# Altium footprint library TinyShuffle v.0.PcbLib: 54 footprints (part 3 of 4)
Each footprint in its own frame and in the unit in brackets; x right, y up, seen from the top. Pads: shape width x height; smd on the part's side, far side on the other; paste and mask are expansions set on the pad; w line width, h text height; cw(c..) or ccw(c..) is an arc to the next point about the centre after c.
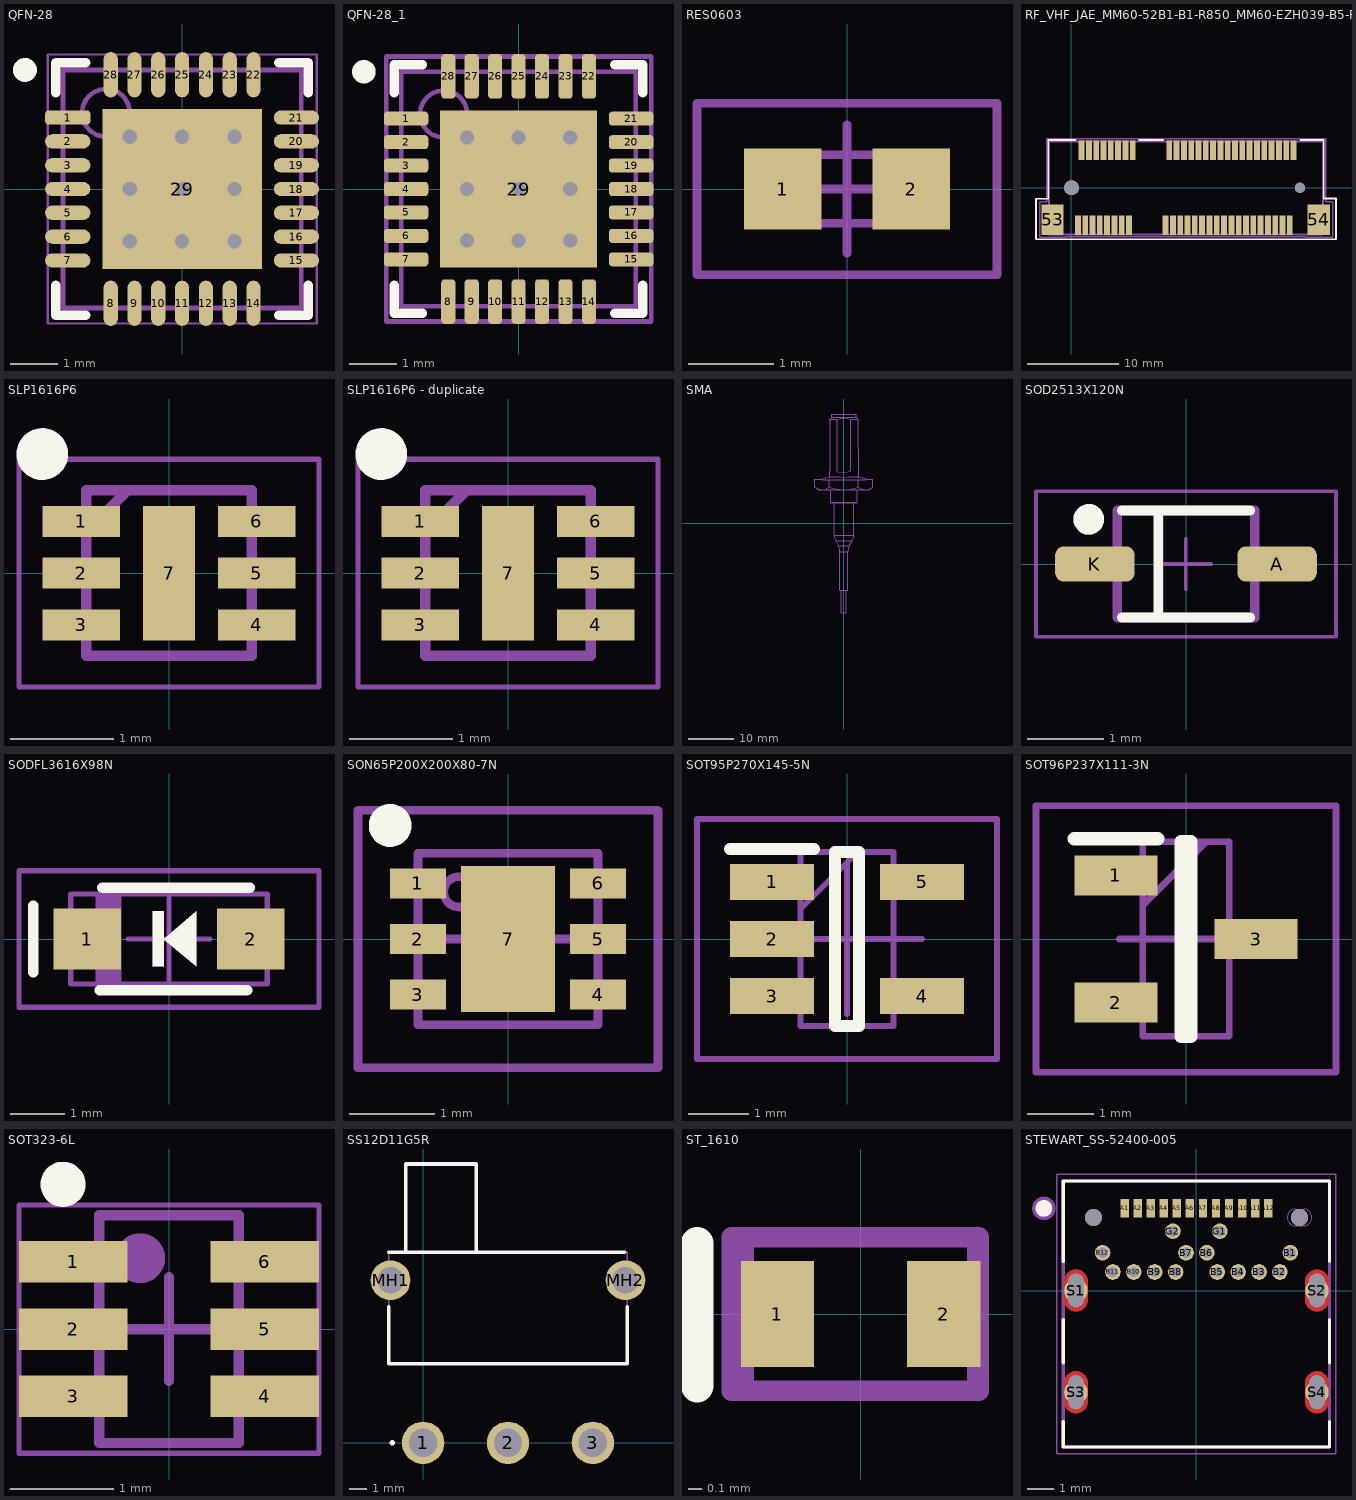
[diagram p2: the footprints below, top view; thin cyan lines are the x and y axes]

## QFN-28 [mm] "QFN, 28-Leads, Body 5,00x5,00mm, Pitch 0,50mm, Thermal Pad 3,20x3,20mm, IPC High Density"
height 0.8
pads (29):
  rrect50% 0.95x0.3 smd: 1(-2.4,1.5)
  oval 0.95x0.3 smd: 2(-2.4,1) 3(-2.4,0.5) 4(-2.4,0) 5(-2.4,-0.5) 6(-2.4,-1) 7(-2.4,-1.5) 15(2.4,-1.5) 16(2.4,-1) 17(2.4,-0.5) 18(2.4,0) 19(2.4,0.5) 20(2.4,1) 21(2.4,1.5)
  oval 0.3x0.95 smd: 8(-1.5,-2.4) 9(-1,-2.4) 10(-0.5,-2.4) 11(0,-2.4) 12(0.5,-2.4) 13(1,-2.4) 14(1.5,-2.4) 22(1.5,2.4) 23(1,2.4) 24(0.5,2.4) 25(0,2.4) 26(-0.5,2.4) 27(-1,2.4) 28(-1.5,2.4)
  rect 3.35x3.35 smd: 29(0,0)
via 0,0 diameter 0.5 hole 0.3
via 1.1,-1.1 diameter 0.5 hole 0.3
via 0,-1.1 diameter 0.5 hole 0.3
via -1.1,-1.1 diameter 0.5 hole 0.3
via 1.1,0 diameter 0.5 hole 0.3
via -1.1,0 diameter 0.5 hole 0.3
via 1.1,1.1 diameter 0.5 hole 0.3
via 0,1.1 diameter 0.5 hole 0.3
via -1.1,1.1 diameter 0.5 hole 0.3
Top Overlay:
  circle w0.25: c-3.3,2.5 r0.125
  lines w0.2: -2.65,-2.025 -2.65,-2.65 -2.025,-2.65 ; -2.65,2.025 -2.65,2.65 -2.025,2.65 ; 2.025,-2.65 2.65,-2.65 2.65,-2.025 ; 2.025,2.65 2.65,2.65 2.65,2.025
Top Assembly (Mech11):
  circle w0.1: c-1.6,1.6 r0.5
  lines w0.1: -2.5,-2.5 2.5,-2.5 2.5,2.5 -2.5,2.5 -2.5,-2.5
Top Courtyard:
  lines w0.05: -2.825,-2.825 2.825,-2.825 2.825,2.825 -2.825,2.825 -2.825,-2.825
  lines w0.1: -0.5,0 0.5,0 ; 0,-0.5 0,0.5
3D body: height 0.8, standoff 0.01, extent -2.5,-2.5 2.5,2.5

## QFN-28_1 [mm] "QFN, 28-Leads, Body 5,00x5,00mm, Pitch 0,50mm, Thermal Pad 3,35x3,35mm, IPC High Density"
height 0.75
pads (29):
  rrect50% 0.95x0.3 smd: 1(-2.4,1.5) 2(-2.4,1) 3(-2.4,0.5) 4(-2.4,0) 5(-2.4,-0.5) 6(-2.4,-1) 7(-2.4,-1.5) 15(2.4,-1.5) 16(2.4,-1) 17(2.4,-0.5) 18(2.4,0) 19(2.4,0.5) 20(2.4,1) 21(2.4,1.5)
  rrect50% 0.3x0.95 smd: 8(-1.5,-2.4) 9(-1,-2.4) 10(-0.5,-2.4) 11(0,-2.4) 12(0.5,-2.4) 13(1,-2.4) 14(1.5,-2.4) 22(1.5,2.4) 23(1,2.4) 24(0.5,2.4) 25(0,2.4) 26(-0.5,2.4) 27(-1,2.4) 28(-1.5,2.4)
  rect 3.35x3.35 smd: 29(0,0)
via 1.1,-1.1 diameter 0.5 hole 0.3
via 0,-1.1 diameter 0.5 hole 0.3
via -1.1,-1.1 diameter 0.5 hole 0.3
via 1.1,0 diameter 0.5 hole 0.3
via 0,0 diameter 0.5 hole 0.3
via -1.1,0 diameter 0.5 hole 0.3
via 1.1,1.1 diameter 0.5 hole 0.3
via 0,1.1 diameter 0.5 hole 0.3
via -1.1,1.1 diameter 0.5 hole 0.3
Top Overlay:
  circle w0.25: c-3.3,2.5 r0.125
  lines w0.2: -2.65,-2.05 -2.65,-2.65 -2.05,-2.65 ; -2.65,2.05 -2.65,2.65 -2.05,2.65 ; 2.05,-2.65 2.65,-2.65 2.65,-2.05 ; 2.05,2.65 2.65,2.65 2.65,2.05
Top Solder:
  region: -2.972,-1.753 -1.753,-1.753 -1.753,-2.972 1.753,-2.972 1.753,-1.778 2.972,-1.778 2.972,1.753 1.829,1.753 1.829,2.972 -1.778,2.972 -1.778,1.753 -2.972,1.753
Top Assembly:
  circle w0.1: c-1.6,1.6 r0.5
  lines w0.1: -2.5,-2.5 2.5,-2.5 2.5,2.5 -2.5,2.5 -2.5,-2.5
Top Courtyard:
  lines w0.1: -0.5,0 0.5,0 ; 0,-0.5 0,0.5 ; -2.825,-2.825 2.825,-2.825 2.825,2.825 -2.825,2.825 -2.825,-2.825
3D body: height 0.75, standoff 0.01, extent -2.5,-2.5 2.5,2.5

## RES0603 [mm]
pads (2):
  rect 0.9x0.95 smd paste-0.05: 1(-0.75,0) 2(0.75,0)
Top 3D Body:
  lines w0.1: -0.775,-0.4 0.775,-0.4 0.775,0.4 -0.775,0.4 -0.775,-0.4
Top Courtyard:
  lines w0.1: -0.75,0 0,0 ; 0,-0.75 0,0 ; 0,0.75 0,0 ; 0.75,0 0,0 ; -1.75,-1 0,-1 1.75,-1 1.75,1 -1.75,1 -1.75,-1
3D body "CPF0603B330RE1.stp": height 0.55, standoff 0, extent -0.775,-0.4 0.775,0.4

## RF_VHF_JAE_MM60-52B1-B1-R850_MM60-EZH039-B5-R850_w_2005_mPCIe_card [mil]
height 45.67
pads (56):
  rect 25x83 smd mask+0.79: 1(27.56,-161.41) 2(43.31,161.42) 3(59.05,-161.41) 4(74.8,161.42) 5(90.55,-161.41) 6(106.3,161.42) 7(122.05,-161.41) 8(137.79,161.42) 9(153.54,-161.41) 10(169.29,161.42) 11(185.04,-161.41) 12(200.79,161.42) 13(216.53,-161.41) 14(232.28,161.42) 15(248.03,-161.41) 16(263.78,161.42) 17(405.51,-161.41) 18(421.26,161.42) 19(437.01,-161.41) 20(452.76,161.42) 21(468.5,-161.41) 22(484.25,161.42) 23(500,-161.41) 24(515.75,161.42) 25(531.5,-161.41) 26(547.24,161.42) 27(562.99,-161.41) 28(578.74,161.42) 29(594.49,-161.41) 30(610.24,161.42) 31(625.98,-161.41) 32(641.73,161.42) 33(657.48,-161.41) 34(673.23,161.42) 35(688.98,-161.41) 36(704.72,161.42) 37(720.47,-161.41) 38(736.22,161.42) 39(751.97,-161.41) 40(767.72,161.42) 41(783.46,-161.41) 42(799.21,161.42) 43(814.96,-161.41) 44(830.71,161.42) 45(846.46,-161.41) 46(862.2,161.42) 47(877.95,-161.41) 48(893.7,161.42) 49(909.45,-161.41) 50(925.2,161.42) 51(940.94,-161.41) 52(956.69,161.42)
  rect 96x132 smd: 53(-81.69,-137.79) 54(1065.94,-137.79)
  round 64.02 hole 64 unplated: ""(0,0)
  round 44.02 hole 44 unplated: ""(984.25,0)
Top Overlay:
  lines w7.99: 17.53,205.79 -100,205.79 -100,-47 -153,-47 -153,-222 1140,-222 1140,-46 1087,-46 1087,205.79 986,205.79 ; 289.56,205.79 395.48,205.79
Top Solder:
  rectangle: 14,-204 262,-119
  rectangle: 28,119 276,204
  rectangle: 408,119 970,204
  rectangle: 391,-204 954,-119
  region: 984.25,32.28 975.9,31.18 968.11,27.95 961.43,22.83 956.3,16.14 953.08,8.36 951.98,0 953.08,-8.35 956.3,-16.14 961.43,-22.82 968.11,-27.95 975.9,-31.17 984.25,-32.27 992.61,-31.17 1000.39,-27.95 1007.07,-22.82 1012.2,-16.14 1015.43,-8.35 1016.53,0 1015.43,8.36 1012.2,16.14 1007.07,22.83 1000.39,27.95 992.61,31.18
  region: 0,42.36 -10.96,40.92 -21.18,36.69 -29.95,29.95 -36.69,21.18 -40.92,10.96 -42.36,0 -40.92,-10.96 -36.69,-21.18 -29.95,-29.96 -21.18,-36.69 -10.96,-40.92 0,-42.36 10.96,-40.92 21.18,-36.69 29.95,-29.96 36.69,-21.18 40.92,-10.96 42.36,0 40.92,10.96 36.69,21.18 29.95,29.95 21.18,36.69 10.96,40.92
Top 3D Body:
  lines w5: -98.37,-203.21 1082.63,-203.21 1082.63,198.79 -98.37,198.79 -98.37,-203.21
  lines w6: -137.09,-213.16 -21.09,-213.16 -21.09,-210.58 1010.54,-210.58 1010.54,-213.16 1126.54,-213.16 1126.54,-61.16 1095.22,-61.16 1095.22,211.42 -106,211.42 -106,-61.16 -137.09,-61.16 -137.09,-213.16 ; -95.78,-200.58 1085.22,-200.58 1085.22,201.42 -95.78,201.42 -95.78,-200.58
3D body "K3D-MM60-52B1-B1-R2 JAE Connector Division Proprietary.STEP": height 149.61, standoff -35.43, extent -92.92,-198.43 1076.37,195.27
3D body "TILE-LB_102120211208.step": height 271.74, standoff 69.61, extent -97.79,-3.35 1083.31,2002.56

## SLP1616P6 [mm] "SON50P160X160X65-7N"
height 0.017
pads (7):
  rect 0.75x0.3 smd paste-0.03 mask+0.127: 1(-0.85,0.5) 2(-0.85,0) 3(-0.85,-0.5) 4(0.85,-0.5) 5(0.85,0) 6(0.85,0.5)
  rect 0.5x1.3 smd paste-0.05 mask+0.127: 7(0,0)
Top Overlay:
  circle w0.25: c-1.225,1.15 r0.125
Top Courtyard:
  lines w0.1: -0.8,0.4 -0.4,0.8 ; -0.8,-0.8 0.8,-0.8 0.8,0.8 -0.8,0.8 -0.8,-0.8
Mechanical 20:
  lines w0.05: -1.45,-1.1 1.45,-1.1 1.45,1.1 -1.45,1.1 -1.45,-1.1
3D body "UCLAMP3306P.TCT.stp": height 0.65, standoff 0, extent -0.85,-0.8 0.85,0.8

## SLP1616P6 - duplicate [mm] "SON50P160X160X65-7N"
height 0.017
pads (7):
  rect 0.75x0.3 smd paste-0.03 mask+0.127: 1(-0.85,0.5) 2(-0.85,0) 3(-0.85,-0.5) 4(0.85,-0.5) 5(0.85,0) 6(0.85,0.5)
  rect 0.5x1.3 smd paste-0.05 mask+0.127: 7(0,0)
Top Overlay:
  circle w0.25: c-1.225,1.15 r0.125
Top Courtyard:
  lines w0.1: -0.8,0.4 -0.4,0.8 ; -0.8,-0.8 0.8,-0.8 0.8,0.8 -0.8,0.8 -0.8,-0.8
Mechanical 20:
  lines w0.05: -1.45,-1.1 1.45,-1.1 1.45,1.1 -1.45,1.1 -1.45,-1.1
3D body "UCLAMP3306P.TCT.stp": height 0.65, standoff 0, extent -0.85,-0.8 0.85,0.8

## SMA [mm] "SMA CONNECTOR"
Top 3D Body:
  lines w0.05: -4.821,9.61 -4.504,9.908 -3.96,9.998 ; -3.955,10 cw(c-1.915,-14.405) 0,10.01 cw(c1.911,-15.771) 3.955,10 ; -3.175,9.51 -3.175,7.901 ; -3.095,22.676 -3.095,22.511 -3.085,11.387 -3.085,10.01 ; -3.092,22.682 -2.929,22.776 -2.722,22.895 ; -3.088,22.676 -3.084,22.685 -3.074,22.689 -3.052,22.695 -2.861,22.72 -1.41,22.72 ; -2.92,7.41 -2.92,4.6 ; -2.73,22.89 -2.73,23.007 -2.665,23.15 ; -2.159,4.5 -2.159,-2.555 ; -1.41,22.436 -1.41,11.346 0.178,11.213 1.41,11.452 1.41,11.617 1.382,22.733 ; -1.41,22.511 -1.41,22.72 ; -0.565,-14.55 -0.565,-19.55 0.565,-19.55 0.565,-14.55 ; 0,9.51 0,10.002 ; 2.159,4.5 2.159,-2.555 ; 2.92,7.41 2.92,4.6 ; 2.999,22.816 2.665,23.15 ; 3.097,10.01 2.994,22.811 2.997,22.809 2.998,22.806 2.996,22.805 2.991,22.803 2.973,22.799 2.906,22.791 1.382,22.733 ; 3.175,9.51 3.175,7.901 ; 3.96,9.998 4.393,9.958 4.819,9.61 ; -6.351,7.901 -5.5,7.41 5.5,7.41 6.351,7.901 ; -6.351,7.901 -6.351,9.61 -4.76,9.61 -4.76,9.51 4.76,9.51 4.76,9.61 6.351,9.61 6.351,7.901 ; -6.351,7.901 -5.642,7.568 -4.763,7.41 -4.075,7.508 -3.175,7.901 ; -3.175,7.901 -1.758,7.568 0,7.41 1.376,7.508 3.175,7.901 ; -2.92,4.6 -2.82,4.5 2.82,4.5 2.92,4.6 ; -2.92,4.6 2.92,4.6 ; -2.665,23.15 -2.665,23.81 -2.565,23.91 2.565,23.91 2.665,23.81 2.665,23.15 ; -2.665,23.15 2.665,23.15 ; -2.159,-2.555 ccw(c0.381,-2.555) -1.819,-3.825 ; -2.159,-2.555 2.159,-2.555 ; -1.819,-3.825 1.819,-3.825 ; -1.819,-3.825 -1.219,-4.864 ; -1.41,22.72 -1.023,22.876 -0.733,22.964 -0.324,23.024 0.202,23.053 0.846,22.933 1.382,22.733 ; -1.219,-4.864 cw(c-3.419,-6.134) -0.879,-6.134 ; -1.219,-4.864 1.219,-4.864 ; -0.879,-6.134 0.879,-6.134 ; -0.879,-6.134 -0.879,-14.55 0.879,-14.55 0.879,-6.134 ; 0.879,-6.134 cw(c3.419,-6.134) 1.219,-4.864 ; 1.219,-4.864 1.819,-3.825 ; 1.819,-3.825 ccw(c-0.381,-2.555) 2.159,-2.555 ; 3.175,7.901 3.884,7.568 4.763,7.41 5.451,7.508 6.351,7.901
3D body "336319-12-SMA.STEP": height 11.5, standoff 0.5, extent -6.351,-19.55 6.351,23.91

## SOD2513X120N [mm]
pads (2):
  rrect50% 1.04x0.46 smd: A(1.19,0) K(-1.19,0)
Top Overlay:
  circle w0.2: c-1.27,0.584 r0.1
  lines w0.127: -0.84,-0.7 0.84,-0.7 ; -0.84,0.7 0.84,0.7 ; -0.364,-0.658 -0.364,0.686
Top Assembly (Mech11):
  circle w0.2: c-1.27,0.584 r0.1
  lines w0.127: -0.356,-0.698 -0.356,0.702 ; -0.9,-0.7 0.9,-0.7 0.9,0.7 -0.9,0.7 -0.9,-0.7
  text "'.Designator'" at -1.304,0.766 h1.1
Top Courtyard:
  lines w0.05: -0.33,0 0.33,0 ; -0.003,-0.33 -0.003,0.325 ; -1.96,-0.95 1.96,-0.95 1.96,0.95 -1.96,0.95 -1.96,-0.95
3D body "User Library-SOD323-1.step": height 1.1, standoff 0, extent -1.325,-0.675 1.275,0.675

## SODFL3616X98N [mm]
pads (2):
  rect 1.24x1.12 smd: 1(-1.5,0) 2(1.5,0)
Top Overlay:
  region: -0.3,0.508 -0.3,-0.5 -0.1,-0.5 -0.1,0.508
  region: -0.1,0 0.5,-0.5 0.5,0.508
  lines w0.2: -2.489,-0.61 -2.489,0.61 ; -1.27,-0.94 1.43,-0.94 ; -1.219,0.94 1.481,0.94
Top Assembly (Mech11):
  rectangle: -1.35,-0.825 -0.875,0.825
  region: -0.3,0 -0.3,0.5 -0.1,0.5 -0.1,0
  region: -0.1,0 0.5,0.5 0.5,0
  region: -0.3,0 -0.3,-0.5 -0.1,-0.5 -0.1,0
  region: -0.1,0 0.5,-0.5 0.5,0
  lines w0.1: -1.8,-0.825 1.8,-0.825 1.8,0.825 -1.8,0.825 -1.8,-0.825
  text "'.Designator'" at -1.659,0.995 h1.1
Top Courtyard:
  lines w0.1: -0.75,0 0,0 ; 0,-0.75 0,0 ; 0,0.75 0,0 ; 0.75,0 0,0 ; -2.75,-1.25 -2.75,1.25 2.75,1.25 2.75,-1.25 0,-1.25 -2.75,-1.25
3D body "NRVB120VLSFT1G.stp": height 0.98, standoff 0, extent -1.8,-0.825 1.8,0.825

## SON65P200X200X80-7N [mm]
pads (7):
  rect 0.65x0.35 smd mask+0.05: 1(-1.05,0.65) 2(-1.05,0) 3(-1.05,-0.65) 4(1.05,-0.65) 5(1.05,0) 6(1.05,0.65)
  rect 1.1x1.7 smd mask+0: 7(0,0)
Top Overlay:
  circle w0.25: c-1.375,1.325 r0.125
Top 3D Body:
  circle w0.1: c-0.573,0.55 r0.177
  lines w0.1: -1.05,-1 1.05,-1 1.05,1 -1.05,1 -1.05,-1
Top Courtyard:
  lines w0.1: -0.75,0 0,0 ; 0,-0.75 0,0 ; 0,0.75 0,0 ; 0.75,0 0,0 ; -1.75,-1.5 0,-1.5 1.75,-1.5 1.75,0 1.75,1.5 0,1.5 -1.75,1.5 -1.75,0 -1.75,-1.5
3D body "NCV8187AMT330TAG.stp": height 0.8, standoff 0, extent -1.05,-1 1.05,1

## SOT95P270X145-5N [mm]
pads (5):
  rect 1.4x0.6 smd paste-0.05: 1(-1.25,0.95) 2(-1.25,0) 3(-1.25,-0.95) 4(1.25,-0.95) 5(1.25,0.95)
Top Overlay:
  lines w0.2: -1.95,1.5 -0.55,1.5 ; -0.2,-1.45 0.2,-1.45 0.2,1.45 -0.2,1.45 -0.2,-1.45
Top 3D Body:
  lines w0.1: -0.775,0.5 0.175,1.45 ; -0.775,-1.45 0.775,-1.45 0.775,1.45 -0.775,1.45 -0.775,-1.45
Top Courtyard:
  lines w0.1: -1.25,0 0,0 ; 0,-1.25 0,0 ; 0,1.25 0,0 ; 1.25,0 0,0 ; -2.5,-2 0,-2 2.5,-2 2.5,0 2.5,2 0,2 -2.5,2 -2.5,0 -2.5,-2
3D body "MCP73831T-2ACI_OT.stp": height 1.45, standoff 0, extent -1.35,-1.45 1.35,1.45

## SOT96P237X111-3N [mm]
pads (3):
  rect 1.25x0.6 smd paste-0.05: 1(-1.05,0.955) 2(-1.05,-0.955) 3(1.05,0)
Top Overlay:
  lines w0.2: -1.675,1.505 -0.425,1.505 ; -0.075,-1.46 -0.075,1.46 0.075,1.46 0.075,-1.46 -0.075,-1.46
Top 3D Body:
  lines w0.1: -0.65,0.505 0.305,1.46 ; -0.65,-1.46 -0.65,1.46 0.65,1.46 0.65,-1.46 -0.65,-1.46
Top Courtyard:
  lines w0.1: -1,0 0,0 ; 0,-1 0,0 ; 0,1 0,0 ; 1,0 0,0 ; -2.25,-2 -2.25,0 -2.25,2 0,2 2.25,2 2.25,0 2.25,-2 0,-2 -2.25,-2
3D body "MMBT2222ALT1G.stp": height 1.11, standoff 0, extent -1.185,-1.46 1.185,1.46

## SOT323-6L [mm] "SOT23, 6-Leads, Body 2,00x2,10mm, Pitch 0,65mm, IPC High Density"
height 1.1
pads (6):
  rect 1.05x0.4 smd paste-0.03 mask+0.05: 1(-0.925,0.65) 2(-0.925,0) 3(-0.925,-0.65) 4(0.925,-0.65) 5(0.925,0) 6(0.925,0.65)
Top Overlay:
  circle w0.25: c-1.025,1.4 r0.093
Top Assembly (Mech11):
  circle w0.254: c-0.279,0.686 r0.114
  lines w0.1: -0.675,-1.1 0.675,-1.1 0.675,1.1 -0.675,1.1 -0.675,-1.1
  text "'.Designator'" at -0.821,1.198 h1.1
Top Courtyard:
  lines w0.05: -1.45,-1.2 1.45,-1.2 1.45,1.2 -1.45,1.2 -1.45,-1.2
  lines w0.1: -0.5,0 0.5,0 ; 0,-0.5 0,0.5
3D body: height 1.1, standoff 0.1, extent -0.675,-1.1 0.675,1.1

## SS12D11G5R [mm]
pads (5):
  round 2.4 hole 1.6: 1(0,0) 2(4.8,0) 3(9.6,0)
  round 2.25 hole 1.5: MH1(-1.85,9.2) MH2(11.45,9.2)
Top Overlay:
  lines w0.2: -1.95,7.7 -1.95,4.48 11.55,4.48 11.55,7.7 ; -1.95,10.78 11.4,10.78 ; -1.8,0 ccw(c-1.75,0) -1.7,0 ; -1.8,0 cw(c-1.75,0) -1.7,0 ; -1.8,0 ccw(c-1.75,0) -1.7,0 ; -1,10.78 3,10.78 3,15.78 -1,15.78 -1,10.78
Top 3D Body:
  lines w0.1: -1.95,4.48 11.55,4.48 11.55,10.78 -1.95,10.78 -1.95,4.48

## ST_1610 [mm]
height 0.6
pads (2):
  rect 0.55x0.8 smd paste-0.05 mask+0.05: 1(-0.625,0) 2(0.625,0)
Top Overlay:
  lines w0.25: -1.23,-0.54 -1.23,0.53
Top Assembly:
  lines w0.15: -0.97,-0.58 0.89,-0.58 0.89,0.58 -0.97,0.58 -0.97,-0.58
  text "'.Designator'" at -1.14,0.968 h1
Top 3D Body:
  lines w0.1: -0.85,-0.55 -0.85,0.55 0.85,0.55 0.85,-0.55 -0.85,-0.55
3D body "ZDO_1610_STM.step": height 0.66, standoff 0, extent -0.851,-0.546 0.851,0.546

## STEWART_SS-52400-005 [mm]
pads (32):
  rect 0.32x0.7 smd: A1(-2.75,3.15) A2(-2.25,3.15) A3(-1.75,3.15) A4(-1.25,3.15) A5(-0.75,3.15) A6(-0.25,3.15) A7(0.25,3.15) A8(0.75,3.15) A9(1.25,3.15) A10(1.75,3.15) A11(2.25,3.15) A12(2.75,3.15)
  round 0.6 hole 0.4: B1(3.6,1.45) B2(3.2,0.71) B3(2.4,0.71) B4(1.6,0.71) B5(0.8,0.71) B6(0.4,1.45) B7(-0.4,1.45) B8(-0.8,0.71) B9(-1.6,0.71) B10(-2.4,0.71) B11(-3.2,0.71) B12(-3.6,1.45) G1(0.9,2.275) G2(-0.9,2.275)
  round 0.9 hole 0.6 slot 1.3 at 90 deg mask+0: S1(-4.62,0) S2(4.62,0) S3(-4.62,-3.9) S4(4.62,-3.9)
  round 0.65 hole 0.65 unplated: ""(-3.95,2.8) ""(3.95,2.8)
Top Layer:
  region: -4.596,0.799 -4.573,0.798 -4.55,0.794 -4.526,0.79 -4.504,0.785 -4.481,0.778 -4.459,0.77 -4.437,0.761 -4.416,0.751 -4.395,0.74 -4.375,0.727 -4.355,0.714 -4.337,0.7 -4.319,0.684 -4.302,0.668 -4.286,0.651 -4.27,0.633 -4.256,0.615 -4.243,0.595 -4.23,0.575 -4.219,0.554 -4.209,0.533 -4.2,0.511 -4.192,0.489 -4.185,0.466 -4.18,0.444 -4.176,0.42 -4.172,0.397 -4.171,0.374 -4.17,0.35 -4.17,-0.35 -4.171,-0.374 -4.172,-0.397 -4.176,-0.42 -4.18,-0.444 -4.185,-0.466 -4.192,-0.489 -4.2,-0.511 -4.209,-0.533 -4.219,-0.554 -4.23,-0.575 -4.243,-0.595 -4.256,-0.615 -4.27,-0.633 -4.286,-0.651 -4.302,-0.668 -4.319,-0.684 -4.337,-0.7 -4.355,-0.714 -4.375,-0.727 -4.395,-0.74 -4.416,-0.751 -4.437,-0.761 -4.459,-0.77 -4.481,-0.778 -4.504,-0.785 -4.526,-0.79 -4.55,-0.794 -4.573,-0.798 -4.596,-0.799 -4.62,-0.8 -4.644,-0.799 -4.667,-0.798 -4.69,-0.794 -4.714,-0.79 -4.736,-0.785 -4.759,-0.778 -4.781,-0.77 -4.803,-0.761 -4.824,-0.751 -4.845,-0.74 -4.865,-0.727 -4.885,-0.714 -4.903,-0.7 -4.921,-0.684 -4.938,-0.668 -4.954,-0.651 -4.97,-0.633 -4.984,-0.615 -4.997,-0.595 -5.01,-0.575 -5.021,-0.554 -5.031,-0.533 -5.04,-0.511 -5.048,-0.489 -5.055,-0.466 -5.06,-0.444 -5.064,-0.42 -5.068,-0.397 -5.069,-0.374 -5.07,-0.35 -5.07,0.35 -5.069,0.374 -5.068,0.397 -5.064,0.42 -5.06,0.444 -5.055,0.466 -5.048,0.489 -5.04,0.511 -5.031,0.533 -5.021,0.554 -5.01,0.575 -4.997,0.595 -4.984,0.615 -4.97,0.633 -4.954,0.651 -4.938,0.668 -4.921,0.684 -4.903,0.7 -4.885,0.714 -4.865,0.727 -4.845,0.74 -4.824,0.751 -4.803,0.761 -4.781,0.77 -4.759,0.778 -4.736,0.785 -4.714,0.79 -4.69,0.794 -4.667,0.798 -4.644,0.799 -4.62,0.8
  region: 4.644,0.799 4.667,0.798 4.69,0.794 4.714,0.79 4.736,0.785 4.759,0.778 4.781,0.77 4.803,0.761 4.824,0.751 4.845,0.74 4.865,0.727 4.885,0.714 4.903,0.7 4.921,0.684 4.938,0.668 4.954,0.651 4.97,0.633 4.984,0.615 4.997,0.595 5.01,0.575 5.021,0.554 5.031,0.533 5.04,0.511 5.048,0.489 5.055,0.466 5.06,0.444 5.064,0.42 5.068,0.397 5.069,0.374 5.07,0.35 5.07,-0.35 5.069,-0.374 5.068,-0.397 5.064,-0.42 5.06,-0.444 5.055,-0.466 5.048,-0.489 5.04,-0.511 5.031,-0.533 5.021,-0.554 5.01,-0.575 4.997,-0.595 4.984,-0.615 4.97,-0.633 4.954,-0.651 4.938,-0.668 4.921,-0.684 4.903,-0.7 4.885,-0.714 4.865,-0.727 4.845,-0.74 4.824,-0.751 4.803,-0.761 4.781,-0.77 4.759,-0.778 4.736,-0.785 4.714,-0.79 4.69,-0.794 4.667,-0.798 4.644,-0.799 4.62,-0.8 4.596,-0.799 4.573,-0.798 4.55,-0.794 4.526,-0.79 4.504,-0.785 4.481,-0.778 4.459,-0.77 4.437,-0.761 4.416,-0.751 4.395,-0.74 4.375,-0.727 4.355,-0.714 4.337,-0.7 4.319,-0.684 4.302,-0.668 4.286,-0.651 4.27,-0.633 4.256,-0.615 4.243,-0.595 4.23,-0.575 4.219,-0.554 4.209,-0.533 4.2,-0.511 4.192,-0.489 4.185,-0.466 4.18,-0.444 4.176,-0.42 4.172,-0.397 4.171,-0.374 4.17,-0.35 4.17,0.35 4.171,0.374 4.172,0.397 4.176,0.42 4.18,0.444 4.185,0.466 4.192,0.489 4.2,0.511 4.209,0.533 4.219,0.554 4.23,0.575 4.243,0.595 4.256,0.615 4.27,0.633 4.286,0.651 4.302,0.668 4.319,0.684 4.337,0.7 4.355,0.714 4.375,0.727 4.395,0.74 4.416,0.751 4.437,0.761 4.459,0.77 4.481,0.778 4.504,0.785 4.526,0.79 4.55,0.794 4.573,0.798 4.596,0.799 4.62,0.8
  region: 4.644,-3.101 4.667,-3.102 4.69,-3.106 4.714,-3.11 4.736,-3.115 4.759,-3.122 4.781,-3.13 4.803,-3.139 4.824,-3.149 4.845,-3.16 4.865,-3.173 4.885,-3.186 4.903,-3.2 4.921,-3.216 4.938,-3.232 4.954,-3.249 4.97,-3.267 4.984,-3.285 4.997,-3.305 5.01,-3.325 5.021,-3.346 5.031,-3.367 5.04,-3.389 5.048,-3.411 5.055,-3.434 5.06,-3.456 5.064,-3.48 5.068,-3.503 5.069,-3.526 5.07,-3.55 5.07,-4.25 5.069,-4.274 5.068,-4.297 5.064,-4.32 5.06,-4.344 5.055,-4.366 5.048,-4.389 5.04,-4.411 5.031,-4.433 5.021,-4.454 5.01,-4.475 4.997,-4.495 4.984,-4.515 4.97,-4.533 4.954,-4.551 4.938,-4.568 4.921,-4.584 4.903,-4.6 4.885,-4.614 4.865,-4.627 4.845,-4.64 4.824,-4.651 4.803,-4.661 4.781,-4.67 4.759,-4.678 4.736,-4.685 4.714,-4.69 4.69,-4.694 4.667,-4.698 4.644,-4.699 4.62,-4.7 4.596,-4.699 4.573,-4.698 4.55,-4.694 4.526,-4.69 4.504,-4.685 4.481,-4.678 4.459,-4.67 4.437,-4.661 4.416,-4.651 4.395,-4.64 4.375,-4.627 4.355,-4.614 4.337,-4.6 4.319,-4.584 4.302,-4.568 4.286,-4.551 4.27,-4.533 4.256,-4.515 4.243,-4.495 4.23,-4.475 4.219,-4.454 4.209,-4.433 4.2,-4.411 4.192,-4.389 4.185,-4.366 4.18,-4.344 4.176,-4.32 4.172,-4.297 4.171,-4.274 4.17,-4.25 4.17,-3.55 4.171,-3.526 4.172,-3.503 4.176,-3.48 4.18,-3.456 4.185,-3.434 4.192,-3.411 4.2,-3.389 4.209,-3.367 4.219,-3.346 4.23,-3.325 4.243,-3.305 4.256,-3.285 4.27,-3.267 4.286,-3.249 4.302,-3.232 4.319,-3.216 4.337,-3.2 4.355,-3.186 4.375,-3.173 4.395,-3.16 4.416,-3.149 4.437,-3.139 4.459,-3.13 4.481,-3.122 4.504,-3.115 4.526,-3.11 4.55,-3.106 4.573,-3.102 4.596,-3.101 4.62,-3.1
  region: -4.596,-3.101 -4.573,-3.102 -4.55,-3.106 -4.526,-3.11 -4.504,-3.115 -4.481,-3.122 -4.459,-3.13 -4.437,-3.139 -4.416,-3.149 -4.395,-3.16 -4.375,-3.173 -4.355,-3.186 -4.337,-3.2 -4.319,-3.216 -4.302,-3.232 -4.286,-3.249 -4.27,-3.267 -4.256,-3.285 -4.243,-3.305 -4.23,-3.325 -4.219,-3.346 -4.209,-3.367 -4.2,-3.389 -4.192,-3.411 -4.185,-3.434 -4.18,-3.456 -4.176,-3.48 -4.172,-3.503 -4.171,-3.526 -4.17,-3.55 -4.17,-4.25 -4.171,-4.274 -4.172,-4.297 -4.176,-4.32 -4.18,-4.344 -4.185,-4.366 -4.192,-4.389 -4.2,-4.411 -4.209,-4.433 -4.219,-4.454 -4.23,-4.475 -4.243,-4.495 -4.256,-4.515 -4.27,-4.533 -4.286,-4.551 -4.302,-4.568 -4.319,-4.584 -4.337,-4.6 -4.355,-4.614 -4.375,-4.627 -4.395,-4.64 -4.416,-4.651 -4.437,-4.661 -4.459,-4.67 -4.481,-4.678 -4.504,-4.685 -4.526,-4.69 -4.55,-4.694 -4.573,-4.698 -4.596,-4.699 -4.62,-4.7 -4.644,-4.699 -4.667,-4.698 -4.69,-4.694 -4.714,-4.69 -4.736,-4.685 -4.759,-4.678 -4.781,-4.67 -4.803,-4.661 -4.824,-4.651 -4.845,-4.64 -4.865,-4.627 -4.885,-4.614 -4.903,-4.6 -4.921,-4.584 -4.938,-4.568 -4.954,-4.551 -4.97,-4.533 -4.984,-4.515 -4.997,-4.495 -5.01,-4.475 -5.021,-4.454 -5.031,-4.433 -5.04,-4.411 -5.048,-4.389 -5.055,-4.366 -5.06,-4.344 -5.064,-4.32 -5.068,-4.297 -5.069,-4.274 -5.07,-4.25 -5.07,-3.55 -5.069,-3.526 -5.068,-3.503 -5.064,-3.48 -5.06,-3.456 -5.055,-3.434 -5.048,-3.411 -5.04,-3.389 -5.031,-3.367 -5.021,-3.346 -5.01,-3.325 -4.997,-3.305 -4.984,-3.285 -4.97,-3.267 -4.954,-3.249 -4.938,-3.232 -4.921,-3.216 -4.903,-3.2 -4.885,-3.186 -4.865,-3.173 -4.845,-3.16 -4.824,-3.149 -4.803,-3.139 -4.781,-3.13 -4.759,-3.122 -4.736,-3.115 -4.714,-3.11 -4.69,-3.106 -4.667,-3.102 -4.644,-3.101 -4.62,-3.1
Bottom Layer:
  region: -4.596,0.799 -4.573,0.798 -4.55,0.794 -4.526,0.79 -4.504,0.785 -4.481,0.778 -4.459,0.77 -4.437,0.761 -4.416,0.751 -4.395,0.74 -4.375,0.727 -4.355,0.714 -4.337,0.7 -4.319,0.684 -4.302,0.668 -4.286,0.651 -4.27,0.633 -4.256,0.615 -4.243,0.595 -4.23,0.575 -4.219,0.554 -4.209,0.533 -4.2,0.511 -4.192,0.489 -4.185,0.466 -4.18,0.444 -4.176,0.42 -4.172,0.397 -4.171,0.374 -4.17,0.35 -4.17,-0.35 -4.171,-0.374 -4.172,-0.397 -4.176,-0.42 -4.18,-0.444 -4.185,-0.466 -4.192,-0.489 -4.2,-0.511 -4.209,-0.533 -4.219,-0.554 -4.23,-0.575 -4.243,-0.595 -4.256,-0.615 -4.27,-0.633 -4.286,-0.651 -4.302,-0.668 -4.319,-0.684 -4.337,-0.7 -4.355,-0.714 -4.375,-0.727 -4.395,-0.74 -4.416,-0.751 -4.437,-0.761 -4.459,-0.77 -4.481,-0.778 -4.504,-0.785 -4.526,-0.79 -4.55,-0.794 -4.573,-0.798 -4.596,-0.799 -4.62,-0.8 -4.644,-0.799 -4.667,-0.798 -4.69,-0.794 -4.714,-0.79 -4.736,-0.785 -4.759,-0.778 -4.781,-0.77 -4.803,-0.761 -4.824,-0.751 -4.845,-0.74 -4.865,-0.727 -4.885,-0.714 -4.903,-0.7 -4.921,-0.684 -4.938,-0.668 -4.954,-0.651 -4.97,-0.633 -4.984,-0.615 -4.997,-0.595 -5.01,-0.575 -5.021,-0.554 -5.031,-0.533 -5.04,-0.511 -5.048,-0.489 -5.055,-0.466 -5.06,-0.444 -5.064,-0.42 -5.068,-0.397 -5.069,-0.374 -5.07,-0.35 -5.07,0.35 -5.069,0.374 -5.068,0.397 -5.064,0.42 -5.06,0.444 -5.055,0.466 -5.048,0.489 -5.04,0.511 -5.031,0.533 -5.021,0.554 -5.01,0.575 -4.997,0.595 -4.984,0.615 -4.97,0.633 -4.954,0.651 -4.938,0.668 -4.921,0.684 -4.903,0.7 -4.885,0.714 -4.865,0.727 -4.845,0.74 -4.824,0.751 -4.803,0.761 -4.781,0.77 -4.759,0.778 -4.736,0.785 -4.714,0.79 -4.69,0.794 -4.667,0.798 -4.644,0.799 -4.62,0.8
  region: 4.644,0.799 4.667,0.798 4.69,0.794 4.714,0.79 4.736,0.785 4.759,0.778 4.781,0.77 4.803,0.761 4.824,0.751 4.845,0.74 4.865,0.727 4.885,0.714 4.903,0.7 4.921,0.684 4.938,0.668 4.954,0.651 4.97,0.633 4.984,0.615 4.997,0.595 5.01,0.575 5.021,0.554 5.031,0.533 5.04,0.511 5.048,0.489 5.055,0.466 5.06,0.444 5.064,0.42 5.068,0.397 5.069,0.374 5.07,0.35 5.07,-0.35 5.069,-0.374 5.068,-0.397 5.064,-0.42 5.06,-0.444 5.055,-0.466 5.048,-0.489 5.04,-0.511 5.031,-0.533 5.021,-0.554 5.01,-0.575 4.997,-0.595 4.984,-0.615 4.97,-0.633 4.954,-0.651 4.938,-0.668 4.921,-0.684 4.903,-0.7 4.885,-0.714 4.865,-0.727 4.845,-0.74 4.824,-0.751 4.803,-0.761 4.781,-0.77 4.759,-0.778 4.736,-0.785 4.714,-0.79 4.69,-0.794 4.667,-0.798 4.644,-0.799 4.62,-0.8 4.596,-0.799 4.573,-0.798 4.55,-0.794 4.526,-0.79 4.504,-0.785 4.481,-0.778 4.459,-0.77 4.437,-0.761 4.416,-0.751 4.395,-0.74 4.375,-0.727 4.355,-0.714 4.337,-0.7 4.319,-0.684 4.302,-0.668 4.286,-0.651 4.27,-0.633 4.256,-0.615 4.243,-0.595 4.23,-0.575 4.219,-0.554 4.209,-0.533 4.2,-0.511 4.192,-0.489 4.185,-0.466 4.18,-0.444 4.176,-0.42 4.172,-0.397 4.171,-0.374 4.17,-0.35 4.17,0.35 4.171,0.374 4.172,0.397 4.176,0.42 4.18,0.444 4.185,0.466 4.192,0.489 4.2,0.511 4.209,0.533 4.219,0.554 4.23,0.575 4.243,0.595 4.256,0.615 4.27,0.633 4.286,0.651 4.302,0.668 4.319,0.684 4.337,0.7 4.355,0.714 4.375,0.727 4.395,0.74 4.416,0.751 4.437,0.761 4.459,0.77 4.481,0.778 4.504,0.785 4.526,0.79 4.55,0.794 4.573,0.798 4.596,0.799 4.62,0.8
  region: 4.644,-3.101 4.667,-3.102 4.69,-3.106 4.714,-3.11 4.736,-3.115 4.759,-3.122 4.781,-3.13 4.803,-3.139 4.824,-3.149 4.845,-3.16 4.865,-3.173 4.885,-3.186 4.903,-3.2 4.921,-3.216 4.938,-3.232 4.954,-3.249 4.97,-3.267 4.984,-3.285 4.997,-3.305 5.01,-3.325 5.021,-3.346 5.031,-3.367 5.04,-3.389 5.048,-3.411 5.055,-3.434 5.06,-3.456 5.064,-3.48 5.068,-3.503 5.069,-3.526 5.07,-3.55 5.07,-4.25 5.069,-4.274 5.068,-4.297 5.064,-4.32 5.06,-4.344 5.055,-4.366 5.048,-4.389 5.04,-4.411 5.031,-4.433 5.021,-4.454 5.01,-4.475 4.997,-4.495 4.984,-4.515 4.97,-4.533 4.954,-4.551 4.938,-4.568 4.921,-4.584 4.903,-4.6 4.885,-4.614 4.865,-4.627 4.845,-4.64 4.824,-4.651 4.803,-4.661 4.781,-4.67 4.759,-4.678 4.736,-4.685 4.714,-4.69 4.69,-4.694 4.667,-4.698 4.644,-4.699 4.62,-4.7 4.596,-4.699 4.573,-4.698 4.55,-4.694 4.526,-4.69 4.504,-4.685 4.481,-4.678 4.459,-4.67 4.437,-4.661 4.416,-4.651 4.395,-4.64 4.375,-4.627 4.355,-4.614 4.337,-4.6 4.319,-4.584 4.302,-4.568 4.286,-4.551 4.27,-4.533 4.256,-4.515 4.243,-4.495 4.23,-4.475 4.219,-4.454 4.209,-4.433 4.2,-4.411 4.192,-4.389 4.185,-4.366 4.18,-4.344 4.176,-4.32 4.172,-4.297 4.171,-4.274 4.17,-4.25 4.17,-3.55 4.171,-3.526 4.172,-3.503 4.176,-3.48 4.18,-3.456 4.185,-3.434 4.192,-3.411 4.2,-3.389 4.209,-3.367 4.219,-3.346 4.23,-3.325 4.243,-3.305 4.256,-3.285 4.27,-3.267 4.286,-3.249 4.302,-3.232 4.319,-3.216 4.337,-3.2 4.355,-3.186 4.375,-3.173 4.395,-3.16 4.416,-3.149 4.437,-3.139 4.459,-3.13 4.481,-3.122 4.504,-3.115 4.526,-3.11 4.55,-3.106 4.573,-3.102 4.596,-3.101 4.62,-3.1
  region: -4.596,-3.101 -4.573,-3.102 -4.55,-3.106 -4.526,-3.11 -4.504,-3.115 -4.481,-3.122 -4.459,-3.13 -4.437,-3.139 -4.416,-3.149 -4.395,-3.16 -4.375,-3.173 -4.355,-3.186 -4.337,-3.2 -4.319,-3.216 -4.302,-3.232 -4.286,-3.249 -4.27,-3.267 -4.256,-3.285 -4.243,-3.305 -4.23,-3.325 -4.219,-3.346 -4.209,-3.367 -4.2,-3.389 -4.192,-3.411 -4.185,-3.434 -4.18,-3.456 -4.176,-3.48 -4.172,-3.503 -4.171,-3.526 -4.17,-3.55 -4.17,-4.25 -4.171,-4.274 -4.172,-4.297 -4.176,-4.32 -4.18,-4.344 -4.185,-4.366 -4.192,-4.389 -4.2,-4.411 -4.209,-4.433 -4.219,-4.454 -4.23,-4.475 -4.243,-4.495 -4.256,-4.515 -4.27,-4.533 -4.286,-4.551 -4.302,-4.568 -4.319,-4.584 -4.337,-4.6 -4.355,-4.614 -4.375,-4.627 -4.395,-4.64 -4.416,-4.651 -4.437,-4.661 -4.459,-4.67 -4.481,-4.678 -4.504,-4.685 -4.526,-4.69 -4.55,-4.694 -4.573,-4.698 -4.596,-4.699 -4.62,-4.7 -4.644,-4.699 -4.667,-4.698 -4.69,-4.694 -4.714,-4.69 -4.736,-4.685 -4.759,-4.678 -4.781,-4.67 -4.803,-4.661 -4.824,-4.651 -4.845,-4.64 -4.865,-4.627 -4.885,-4.614 -4.903,-4.6 -4.921,-4.584 -4.938,-4.568 -4.954,-4.551 -4.97,-4.533 -4.984,-4.515 -4.997,-4.495 -5.01,-4.475 -5.021,-4.454 -5.031,-4.433 -5.04,-4.411 -5.048,-4.389 -5.055,-4.366 -5.06,-4.344 -5.064,-4.32 -5.068,-4.297 -5.069,-4.274 -5.07,-4.25 -5.07,-3.55 -5.069,-3.526 -5.068,-3.503 -5.064,-3.48 -5.06,-3.456 -5.055,-3.434 -5.048,-3.411 -5.04,-3.389 -5.031,-3.367 -5.021,-3.346 -5.01,-3.325 -4.997,-3.305 -4.984,-3.285 -4.97,-3.267 -4.954,-3.249 -4.938,-3.232 -4.921,-3.216 -4.903,-3.2 -4.885,-3.186 -4.865,-3.173 -4.845,-3.16 -4.824,-3.149 -4.803,-3.139 -4.781,-3.13 -4.759,-3.122 -4.736,-3.115 -4.714,-3.11 -4.69,-3.106 -4.667,-3.102 -4.644,-3.101 -4.62,-3.1
Top Overlay:
  circle w0.35: c-5.85,3.15 r0.144
  lines w0.127: -5.1,-5.02 -5.1,-6 5.1,-6 5.1,-5.02 ; -5.1,-2.78 -5.1,-1.12 ; -5.1,1.12 -5.1,4.2 5.1,4.2 5.1,1.12 ; 5.1,-2.78 5.1,-1.12
Top Solder:
  drawing of 4 lines, arcs and shapes, not listed
Bottom Solder:
  drawing of 4 lines, arcs and shapes, not listed
Mechanical 1:
  lines w0: 3.475,2.8 cw(c3.8,2.8) 3.8,3.125 4.1,3.125 cw(c4.1,2.8) 4.425,2.8 cw(c4.1,2.8) 4.1,2.475 3.8,2.475 cw(c3.8,2.8) 3.475,2.8
Top Assembly (Mech11):
  circle w0.3: c-5.85,3.15 r0.3
  lines w0.127: -5.1,-6 -5.1,4.2 5.1,4.2 5.1,-6 -5.1,-6
Top Courtyard:
  lines w0.05: -5.35,-6.25 -5.35,4.45 5.35,4.45 5.35,-6.25 -5.35,-6.25